# Altium footprint library aiskylab-01Resistors.PcbLib: 208 footprints (part 12 of 13)
Each footprint in its own frame and in the unit in brackets; x right, y up, seen from the top. Pads: shape width x height; smd on the part's side, far side on the other; paste and mask are expansions set on the pad; w line width, h text height; cw(c..) or ccw(c..) is an arc to the next point about the centre after c.
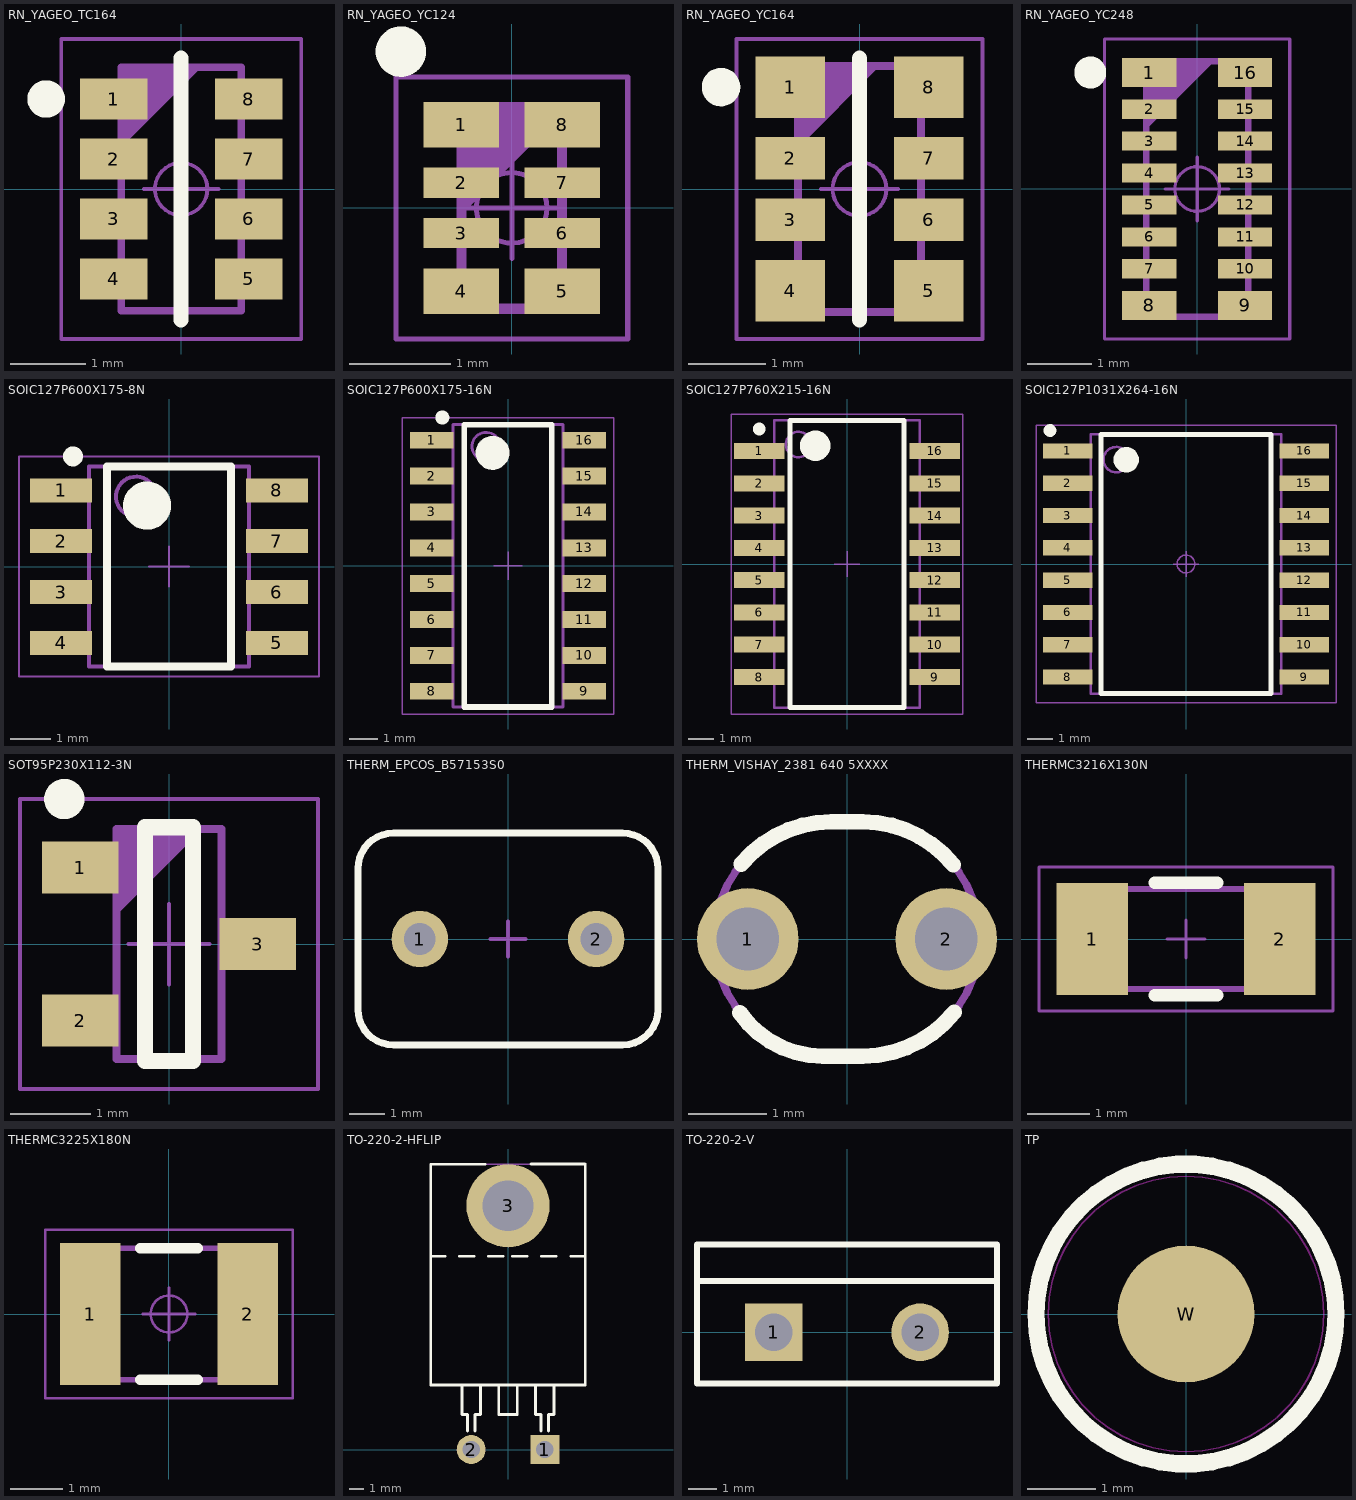
[diagram p11: the footprints below, top view; thin cyan lines are the x and y axes]

## RN_YAGEO_TC164 [mm] "Resistor, Chip Array, Concave, Pitch 0.80mm, 8 pin,1.60mm W X 3.20mm L X 0.70mm H, Type TC164, IPC Medium Density"
height 0.7
pads (8):
  rect 0.9x0.55 smd: 1(-0.9,1.2) 2(-0.9,0.4) 3(-0.9,-0.4) 4(-0.9,-1.2) 5(0.9,-1.2) 6(0.9,-0.4) 7(0.9,0.4) 8(0.9,1.2)
Top Overlay:
  circle w0.25: c-1.8,1.2 r0.125
  lines w0.2: 0,-1.75 0,1.75
Top Designator:
  text ".Designator" at -7.83,-0.508 h1.52
Top Assembly:
  lines w0.1: -0.8,0.625 0.2,1.625 ; -0.8,0.725 0.1,1.625 ; -0.8,0.825 0,1.625 ; -0.8,0.925 -0.1,1.625 ; -0.8,1.025 -0.2,1.625 ; -0.8,1.125 -0.3,1.625 ; -0.8,1.225 -0.4,1.625 ; -0.8,1.325 -0.5,1.625 ; -0.8,1.425 -0.6,1.625 ; -0.8,1.525 -0.7,1.625 ; -0.8,-1.625 -0.8,1.625 0.8,1.625 0.8,-1.625 -0.8,-1.625
Bottom 3D Body:
  circle w0.05: c0,0 r0.35
  lines w0.05: -0.5,0 0.5,0 ; 0,-0.5 0,0.5 ; -1.6,-2 1.6,-2 1.6,2 -1.6,2 -1.6,-2
3D body "p090-055.stp": height 0.02, standoff 0, extent -1.35,-1.475 -0.45,-0.925
3D body "p090-055.stp": height 0.02, standoff 0, extent -1.35,-0.675 -0.45,-0.125
3D body "p090-055.stp": height 0.02, standoff 0, extent -1.35,0.125 -0.45,0.675
3D body "p090-055.stp": height 0.02, standoff 0, extent -1.35,0.925 -0.45,1.475
3D body "p090-055.stp": height 0.02, standoff 0, extent 0.45,-1.475 1.35,-0.925
3D body "p090-055.stp": height 0.02, standoff 0, extent 0.45,-0.675 1.35,-0.125
3D body "p090-055.stp": height 0.02, standoff 0, extent 0.45,0.125 1.35,0.675
3D body "p090-055.stp": height 0.02, standoff 0, extent 0.45,0.925 1.35,1.475
3D body "RN_YAGEO_TC164.stp": height 0.7, standoff 0, extent -0.8,-1.65 0.8,1.65

## RN_YAGEO_YC124 [mm] "Resistor, Chip Array, Convex S Version, Pitch 0.50mm, 8 pin, 1mm W X 2mm L X 0.55mm H, Type YC124, IPC Medium Density"
height 0.7
pads (8):
  rect 0.75x0.45 smd: 1(-0.5,0.825) 4(-0.5,-0.825) 5(0.5,-0.825) 8(0.5,0.825)
  rect 0.75x0.3 smd: 2(-0.5,0.25) 3(-0.5,-0.25) 6(0.5,-0.25) 7(0.5,0.25)
Top Overlay:
  circle w0.25: c-1.1,1.55 r0.125
Top Designator:
  text ".Designator" at -7.705,-0.27 h1.52
Top Assembly:
  lines w0.1: 0.5,1 0.5,-1 -0.5,-1 -0.5,1 0.5,1 ; 0.5,1 -0.5,0 0.5,1 ; -0.5,0.1 0.4,1 -0.5,0.1 ; -0.5,0.2 0.3,1 -0.5,0.2 ; -0.5,0.3 0.2,1 -0.5,0.3 ; -0.5,0.4 0.1,1 -0.5,0.4 ; -0.5,0.5 0,1 -0.5,0.5 ; -0.5,0.6 -0.1,1 -0.5,0.6 ; -0.5,0.7 -0.2,1 -0.5,0.7 ; -0.5,0.8 -0.3,1 -0.5,0.8 ; -0.5,0.9 -0.4,1 -0.5,0.9
Bottom 3D Body:
  circle w0.05: c0,0 r0.35
  lines w0.05: -0.5,0 0.5,0 ; 0,-0.5 0,0.5 ; -1.15,-1.3 -1.15,1.3 1.15,1.3 1.15,-1.3 -1.15,-1.3
3D body "p075-030.stp": height 0.02, standoff 0, extent -0.875,-0.4 -0.125,-0.1
3D body "p075-045.stp": height 0.02, standoff 0, extent -0.875,-1.05 -0.125,-0.6
3D body "p075-030.stp": height 0.02, standoff 0, extent -0.875,0.1 -0.125,0.4
3D body "p075-045.stp": height 0.02, standoff 0, extent -0.875,0.6 -0.125,1.05
3D body "p075-030.stp": height 0.02, standoff 0, extent 0.125,-0.4 0.875,-0.1
3D body "p075-045.stp": height 0.02, standoff 0, extent 0.125,-1.05 0.875,-0.6
3D body "p075-030.stp": height 0.02, standoff 0, extent 0.125,0.1 0.875,0.4
3D body "p075-045.stp": height 0.02, standoff 0, extent 0.125,0.6 0.875,1.05
3D body "RN_YAGEO_YC124.stp": height 0.55, standoff 0, extent -0.55,-1.05 0.55,1.05

## RN_YAGEO_YC164 [mm] "Resistor, Chip Array, Convex S Version, Pitch 0.80mm, 8 pin, 1.60mm W X 3.20mm L X 0.70mm H, Type YC164, IPC Medium Density"
height 0.7
pads (8):
  rect 0.9x0.8 smd: 1(-0.9,1.325) 4(-0.9,-1.325) 5(0.9,-1.325) 8(0.9,1.325)
  rect 0.9x0.55 smd: 2(-0.9,0.4) 3(-0.9,-0.4) 6(0.9,-0.4) 7(0.9,0.4)
Top Overlay:
  circle w0.25: c-1.8,1.325 r0.125
  lines w0.2: 0,-1.7 0,1.7
Top Designator:
  text ".Designator" at -7.83,-0.508 h1.52
Top Assembly:
  lines w0.1: -0.8,-1.6 -0.8,1.6 0.8,1.6 0.8,-1.6 -0.8,-1.6 ; -0.8,0.6 0.2,1.6 -0.8,0.6 ; -0.8,0.7 0.1,1.6 -0.8,0.7 ; -0.8,0.8 0,1.6 -0.8,0.8 ; -0.8,0.9 -0.1,1.6 -0.8,0.9 ; -0.8,1 -0.2,1.6 -0.8,1 ; -0.8,1.1 -0.3,1.6 -0.8,1.1 ; -0.8,1.2 -0.4,1.6 -0.8,1.2 ; -0.8,1.3 -0.5,1.6 -0.8,1.3 ; -0.8,1.4 -0.6,1.6 -0.8,1.4 ; -0.8,1.5 -0.7,1.6 -0.8,1.5
Bottom 3D Body:
  circle w0.05: c0,0 r0.35
  lines w0.05: -0.5,0 0.5,0 ; 0,-0.5 0,0.5 ; -1.6,-1.95 1.6,-1.95 1.6,1.95 -1.6,1.95 -1.6,-1.95
3D body "p090-055.stp": height 0.02, standoff 0, extent -1.35,-0.675 -0.45,-0.125
3D body "p090-080.stp": height 0.02, standoff 0, extent -1.35,-1.75 -0.45,-0.95
3D body "p090-055.stp": height 0.02, standoff 0, extent -1.35,0.125 -0.45,0.675
3D body "p090-080.stp": height 0.02, standoff 0, extent -1.35,0.925 -0.45,1.725
3D body "p090-055.stp": height 0.02, standoff 0, extent 0.45,-0.675 1.35,-0.125
3D body "p090-080.stp": height 0.02, standoff 0, extent 0.45,-1.725 1.35,-0.925
3D body "p090-055.stp": height 0.02, standoff 0, extent 0.45,0.125 1.35,0.675
3D body "p090-080.stp": height 0.02, standoff 0, extent 0.45,0.925 1.35,1.725
3D body "RN_YAGEO_YC164.stp": height 0.7, standoff 0, extent -0.8,-1.65 0.8,1.65

## RN_YAGEO_YC248 [mm] "Resistor, Chip Array, 0.50mm pitch; 16 pin, 1.60mm W X 4mm L X 0.55mm H, YC248 Serie"
height 0.55
pads (16):
  rect 0.85x0.45 smd: 1(-0.75,1.825) 8(-0.75,-1.825) 9(0.75,-1.825) 16(0.75,1.825)
  rect 0.85x0.3 smd: 2(-0.75,1.25) 3(-0.75,0.75) 4(-0.75,0.25) 5(-0.75,-0.25) 6(-0.75,-0.75) 7(-0.75,-1.25) 10(0.75,-1.25) 11(0.75,-0.75) 12(0.75,-0.25) 13(0.75,0.25) 14(0.75,0.75) 15(0.75,1.25)
Top Overlay:
  circle w0.25: c-1.675,1.825 r0.125
Top Designator:
  text ".Designator" at -7.843,-0.508 h1.52
Top Assembly:
  lines w0.1: -0.8,-2 -0.8,2 0.8,2 0.8,-2 -0.8,-2 ; -0.8,1 0.2,2 -0.8,1 ; -0.8,1.1 0.1,2 -0.8,1.1 ; -0.8,1.2 0,2 -0.8,1.2 ; -0.8,1.3 -0.1,2 -0.8,1.3 ; -0.8,1.4 -0.2,2 -0.8,1.4 ; -0.8,1.5 -0.3,2 -0.8,1.5 ; -0.8,1.6 -0.4,2 -0.8,1.6 ; -0.8,1.7 -0.5,2 -0.8,1.7 ; -0.8,1.8 -0.6,2 -0.8,1.8 ; -0.8,1.9 -0.7,2 -0.8,1.9
Bottom 3D Body:
  circle w0.05: c0,0 r0.35
  lines w0.05: -0.5,0 0.5,0 ; 0,-0.5 0,0.5 ; -1.45,-2.35 -1.45,2.35 1.45,2.35 1.45,-2.35 -1.45,-2.35
3D body "p085-030.stp": height 0.02, standoff 0, extent -1.175,-0.4 -0.325,-0.1
3D body "p085-030.stp": height 0.02, standoff 0, extent -1.175,-0.9 -0.325,-0.6
3D body "p085-030.stp": height 0.02, standoff 0, extent -1.175,-1.4 -0.325,-1.1
3D body "p085-030.stp": height 0.02, standoff 0, extent -1.175,1.1 -0.325,1.4
3D body "p085-030.stp": height 0.02, standoff 0, extent -1.175,0.6 -0.325,0.9
3D body "p085-030.stp": height 0.02, standoff 0, extent -1.175,0.1 -0.325,0.4
3D body "p085-030.stp": height 0.02, standoff 0, extent 0.325,-1.4 1.175,-1.1
3D body "p085-030.stp": height 0.02, standoff 0, extent 0.325,-0.9 1.175,-0.6
3D body "p085-030.stp": height 0.02, standoff 0, extent 0.325,-0.4 1.175,-0.1
3D body "p085-030.stp": height 0.02, standoff 0, extent 0.325,0.1 1.175,0.4
3D body "p085-030.stp": height 0.02, standoff 0, extent 0.325,0.6 1.175,0.9
3D body "p085-030.stp": height 0.02, standoff 0, extent 0.325,1.1 1.175,1.4
3D body "p085-045.stp": height 0.02, standoff 0, extent -1.175,-2.05 -0.325,-1.6
3D body "p085-045.stp": height 0.02, standoff 0, extent -1.175,1.6 -0.325,2.05
3D body "p085-045.stp": height 0.02, standoff 0, extent 0.325,-2.05 1.175,-1.6
3D body "p085-045.stp": height 0.02, standoff 0, extent 0.325,1.6 1.175,2.05
3D body "RN_YAGEO_YC248.stp": height 0.45, standoff 0, extent -0.8,-2 0.8,2

## SOIC127P600X175-8N [mm] "SOIC 8, Pitch 1.27mm - Body 4x5mm, IPC Medium Density"
height 1.75
pads (8):
  rect 1.55x0.6 smd: 1(-2.7,1.905) 2(-2.7,0.635) 3(-2.7,-0.635) 4(-2.7,-1.905) 5(2.7,-1.905) 6(2.7,-0.635) 7(2.7,0.635) 8(2.7,1.905)
Top Overlay:
  circle w0.6: c-0.55,1.525 r0.3
  circle w0.25: c-2.4,2.755 r0.125
  lines w0.2: -1.55,-2.5 1.55,-2.5 1.55,2.5 -1.55,2.5 -1.55,-2.5
Top Designator:
  text ".Designator" at -7.618,-0.393 h1.52
Top Assembly:
  circle w0.1: c-0.825,1.75 r0.5
  lines w0.1: -2,-2.5 -2,2.5 2,2.5 2,-2.5 -2,-2.5
Bottom 3D Body:
  lines w0.05: -0.5,0 0.5,0 ; 0,-0.5 0,0.5 ; -3.75,-2.75 3.75,-2.75 3.75,2.75 -3.75,2.75 -3.75,-2.75
3D body "p155-060.stp": height 0.02, standoff 0, extent -3.475,-0.935 -1.925,-0.335
3D body "p155-060.stp": height 0.02, standoff 0, extent -3.475,0.335 -1.925,0.935
3D body "p155-060.stp": height 0.02, standoff 0, extent 1.925,-0.935 3.475,-0.335
3D body "p155-060.stp": height 0.02, standoff 0, extent 1.925,0.335 3.475,0.935
3D body "p155-060.stp": height 0.02, standoff 0, extent -3.475,-2.205 -1.925,-1.605
3D body "p155-060.stp": height 0.02, standoff 0, extent -3.475,1.605 -1.925,2.205
3D body "p155-060.stp": height 0.02, standoff 0, extent 1.925,-2.205 3.475,-1.605
3D body "p155-060.stp": height 0.02, standoff 0, extent 1.925,1.605 3.475,2.205
3D body "SOIC127P600X175-8N.stp": height 1.75, standoff 0, extent -3.1,-2.5 3.1,2.5

## SOIC127P600X175-16N [mm] "SOIC 16, Pitch 1.27mm - Body 4x10mm, IPC Medium Density"
height 1.75
pads (16):
  rect 1.55x0.6 smd: 1(-2.7,4.445) 2(-2.7,3.175) 3(-2.7,1.905) 4(-2.7,0.635) 5(-2.7,-0.635) 6(-2.7,-1.905) 7(-2.7,-3.175) 8(-2.7,-4.445) 9(2.7,-4.445) 10(2.7,-3.175) 11(2.7,-1.905) 12(2.7,-0.635) 13(2.7,0.635) 14(2.7,1.905) 15(2.7,3.175) 16(2.7,4.445)
Top Overlay:
  circle w0.6: c-0.55,4 r0.3
  circle w0.25: c-2.325,5.25 r0.125
  lines w0.2: -1.55,-5 1.55,-5 1.55,5 -1.55,5 -1.55,-5
Top Designator:
  text ".Designator" at -7.618,-0.395 h1.52
Top Assembly:
  circle w0.1: c-0.775,4.225 r0.5
  lines w0.1: -1.95,-5 -1.95,5 1.95,5 1.95,-5 -1.95,-5
Bottom 3D Body:
  lines w0.05: -0.5,0 0.5,0 ; 0,-0.5 0,0.5 ; -3.75,-5.25 3.75,-5.25 3.75,5.25 -3.75,5.25 -3.75,-5.25
3D body "p155-060.stp": height 0.02, standoff 0, extent -3.475,-4.745 -1.925,-4.145
3D body "p155-060.stp": height 0.02, standoff 0, extent -3.475,-3.475 -1.925,-2.875
3D body "p155-060.stp": height 0.02, standoff 0, extent -3.475,-0.935 -1.925,-0.335
3D body "p155-060.stp": height 0.02, standoff 0, extent -3.475,0.335 -1.925,0.935
3D body "p155-060.stp": height 0.02, standoff 0, extent -3.475,2.875 -1.925,3.475
3D body "p155-060.stp": height 0.02, standoff 0, extent -3.475,4.145 -1.925,4.745
3D body "p155-060.stp": height 0.02, standoff 0, extent 1.925,-4.745 3.475,-4.145
3D body "p155-060.stp": height 0.02, standoff 0, extent 1.925,-3.475 3.475,-2.875
3D body "p155-060.stp": height 0.02, standoff 0, extent 1.925,-0.935 3.475,-0.335
3D body "p155-060.stp": height 0.02, standoff 0, extent 1.925,0.335 3.475,0.935
3D body "p155-060.stp": height 0.02, standoff 0, extent 1.925,2.875 3.475,3.475
3D body "p155-060.stp": height 0.02, standoff 0, extent 1.925,4.145 3.475,4.745
3D body "p155-060.stp": height 0.02, standoff 0, extent -3.475,-2.205 -1.925,-1.605
3D body "p155-060.stp": height 0.02, standoff 0, extent -3.475,1.605 -1.925,2.205
3D body "p155-060.stp": height 0.02, standoff 0, extent 1.925,-2.205 3.475,-1.605
3D body "p155-060.stp": height 0.02, standoff 0, extent 1.925,1.605 3.475,2.205
3D body "SOIC127P600X175-16N.stp": height 1.75, standoff 0, extent -3.1,-5 3.1,5

## SOIC127P760X215-16N [mm] "SOIC, 16-Leads, Body 11.3x5.7mm (max), Pitch 1.27mm, IPC Medium Density"
height 2.15
pads (16):
  rect 2x0.63 smd: 1(-3.45,4.445) 2(-3.45,3.175) 3(-3.45,1.905) 4(-3.45,0.635) 5(-3.45,-0.635) 6(-3.45,-1.905) 7(-3.45,-3.175) 8(-3.45,-4.445) 9(3.45,-4.445) 10(3.45,-3.175) 11(3.45,-1.905) 12(3.45,-0.635) 13(3.45,0.635) 14(3.45,1.905) 15(3.45,3.175) 16(3.45,4.445)
Top Overlay:
  circle w0.6: c-1.25,4.65 r0.3
  circle w0.25: c-3.45,5.31 r0.125
  lines w0.2: -2.25,-5.65 2.25,-5.65 2.25,5.65 -2.25,5.65 -2.25,-5.65
Top Designator:
  text ".Designator" at -7.618,-0.508 h1.52
Top Assembly:
  circle w0.1: c-1.905,4.7 r0.5
  lines w0.1: -2.855,-5.65 -2.855,5.65 2.855,5.65 2.855,-5.65 -2.855,-5.65
Bottom 3D Body:
  lines w0.05: -0.5,0 0.5,0 ; 0,-0.5 0,0.5 ; -4.55,-5.9 4.55,-5.9 4.55,5.9 -4.55,5.9 -4.55,-5.9
3D body "p200-063.stp": height 0.02, standoff 0, extent -4.45,-4.76 -2.45,-4.13
3D body "p200-063.stp": height 0.02, standoff 0, extent -4.45,-3.49 -2.45,-2.86
3D body "p200-063.stp": height 0.02, standoff 0, extent -4.45,-0.95 -2.45,-0.32
3D body "p200-063.stp": height 0.02, standoff 0, extent -4.45,0.32 -2.45,0.95
3D body "p200-063.stp": height 0.02, standoff 0, extent -4.45,2.86 -2.45,3.49
3D body "p200-063.stp": height 0.02, standoff 0, extent -4.45,4.13 -2.45,4.76
3D body "p200-063.stp": height 0.02, standoff 0, extent 2.45,-4.76 4.45,-4.13
3D body "p200-063.stp": height 0.02, standoff 0, extent 2.45,-3.49 4.45,-2.86
3D body "p200-063.stp": height 0.02, standoff 0, extent 2.45,-0.95 4.45,-0.32
3D body "p200-063.stp": height 0.02, standoff 0, extent 2.45,0.32 4.45,0.95
3D body "p200-063.stp": height 0.02, standoff 0, extent 2.45,2.86 4.45,3.49
3D body "p200-063.stp": height 0.02, standoff 0, extent 2.45,4.13 4.45,4.76
3D body "p200-063.stp": height 0.02, standoff 0, extent -4.45,-2.22 -2.45,-1.59
3D body "p200-063.stp": height 0.02, standoff 0, extent -4.45,1.59 -2.45,2.22
3D body "p200-063.stp": height 0.02, standoff 0, extent 2.45,-2.22 4.45,-1.59
3D body "p200-063.stp": height 0.02, standoff 0, extent 2.45,1.59 4.45,2.22
3D body "SOIC127P760X215-16N.stp": height 2.15, standoff -0.02, extent -3.81,-5.65 3.81,5.65

## SOIC127P1031X264-16N [mm] "SOIC, 1.27mm Pitch;16 Pin, 7.49mm W X 10.21mm L X 2.64mm H body, IPC Medium Density"
height 2.64
pads (16):
  rect 1.95x0.6 smd: 1(-4.65,4.445) 2(-4.65,3.175) 3(-4.65,1.905) 4(-4.65,0.635) 5(-4.65,-0.635) 6(-4.65,-1.905) 7(-4.65,-3.175) 8(-4.65,-4.445) 9(4.65,-4.445) 10(4.65,-3.175) 11(4.65,-1.905) 12(4.65,-0.635) 13(4.65,0.635) 14(4.65,1.905) 15(4.65,3.175) 16(4.65,4.445)
Top Overlay:
  circle w0.5: c-2.35,4.1 r0.25
  circle w0.25: c-5.35,5.25 r0.125
  lines w0.2: -3.35,-5.1 3.35,-5.1 3.35,5.1 -3.35,5.1 -3.35,-5.1
Top Designator:
  text ".Designator" at -7.618,-0.495 h1.52
Top Assembly:
  circle w0.1: c-2.745,4.105 r0.5
  lines w0.1: -3.745,-5.105 -3.745,5.105 3.745,5.105 3.745,-5.105 -3.745,-5.105
Bottom 3D Body:
  circle w0.05: c0,0 r0.35
  lines w0.05: -0.5,0 0.5,0 ; 0,-0.5 0,0.5 ; -5.9,-5.45 5.9,-5.45 5.9,5.45 -5.9,5.45 -5.9,-5.45
3D body "p195-060.stp": height 0.02, standoff 0, extent -5.625,-4.745 -3.675,-4.145
3D body "p195-060.stp": height 0.02, standoff 0, extent -5.625,-3.475 -3.675,-2.875
3D body "p195-060.stp": height 0.02, standoff 0, extent -5.625,-0.935 -3.675,-0.335
3D body "p195-060.stp": height 0.02, standoff 0, extent -5.625,0.335 -3.675,0.935
3D body "p195-060.stp": height 0.02, standoff 0, extent -5.625,2.875 -3.675,3.475
3D body "p195-060.stp": height 0.02, standoff 0, extent -5.625,4.145 -3.675,4.745
3D body "p195-060.stp": height 0.02, standoff 0, extent 3.675,-4.745 5.625,-4.145
3D body "p195-060.stp": height 0.02, standoff 0, extent 3.675,-3.475 5.625,-2.875
3D body "p195-060.stp": height 0.02, standoff 0, extent 3.675,-0.935 5.625,-0.335
3D body "p195-060.stp": height 0.02, standoff 0, extent 3.675,0.335 5.625,0.935
3D body "p195-060.stp": height 0.02, standoff 0, extent 3.675,2.875 5.625,3.475
3D body "p195-060.stp": height 0.02, standoff 0, extent 3.675,4.145 5.625,4.745
3D body "p195-060.stp": height 0.02, standoff 0, extent -5.625,-2.205 -3.675,-1.605
3D body "p195-060.stp": height 0.02, standoff 0, extent -5.625,1.605 -3.675,2.205
3D body "p195-060.stp": height 0.02, standoff 0, extent 3.675,-2.205 5.625,-1.605
3D body "p195-060.stp": height 0.02, standoff 0, extent 3.675,1.605 5.625,2.205
3D body "SOIC127P1031X264-16N.stp": height 2.65, standoff 0, extent -5.215,-5.151 5.215,5.151

## SOT95P230X112-3N [mm] "SOT23 3-Leads, Pitch 0.95mm - Body 1.3x2.86mm, IPC Medium Density"
height 1.1
pads (3):
  rect 0.95x0.65 smd: 1(-1.1,0.95) 2(-1.1,-0.95) 3(1.1,0)
Top Overlay:
  circle w0.25: c-1.3,1.8 r0.125
  lines w0.2: -0.3,-1.45 -0.3,1.45 0.3,1.45 0.3,-1.45 -0.3,-1.45
Top Designator:
  text ".Designator" at -7.618,-0.395 h1.52
Top Assembly:
  lines w0.1: -0.65,0.43 0.35,1.43 ; -0.65,0.53 0.25,1.43 ; -0.65,0.63 0.15,1.43 ; -0.65,0.73 0.05,1.43 ; -0.65,0.83 -0.05,1.43 ; -0.65,0.93 -0.15,1.43 ; -0.65,1.03 -0.25,1.43 ; -0.65,1.13 -0.35,1.43 ; -0.65,1.23 -0.45,1.43 ; -0.65,1.33 -0.55,1.43 ; -0.65,-1.43 -0.65,1.43 0.65,1.43 0.65,-1.43 -0.65,-1.43
Bottom 3D Body:
  lines w0.05: -0.5,0 0.5,0 ; 0,-0.5 0,0.5 ; -1.85,-1.8 1.85,-1.8 1.85,1.8 -1.85,1.8 -1.85,-1.8
3D body "p095-065.stp": height 0.02, standoff 0, extent -1.575,-1.275 -0.625,-0.625
3D body "p095-065.stp": height 0.02, standoff 0, extent -1.575,0.625 -0.625,1.275
3D body "p095-065.stp": height 0.02, standoff 0, extent 0.625,-0.325 1.575,0.325
3D body "SOT95P240X110-3N.stp": height 1.1, standoff 0, extent -1.25,-1.5 1.25,1.5

## THERM_EPCOS_B57153S0 [mm] "NTC thermistors, Body  D 8.5mm x W 6mm x H 13mmxxx"
height 13
pads (2):
  round 1.6 hole 0.9: 1(-2.5,0) 2(2.5,0)
Top Overlay:
  lines w0.2: -4.25,-2 ccw(c-3.25,-2) -3.25,-3 3.25,-3 ccw(c3.25,-2) 4.25,-2 4.25,2 ccw(c3.25,2) 3.25,3 -3.25,3 ccw(c-3.25,2) -4.25,2 -4.25,-2
Top Designator:
  text ".Designator" at -7.618,-0.508 h1.52
Top Assembly:
  lines w0.1: -4.25,-2 ccw(c-3.25,-2) -3.25,-3 3.25,-3 ccw(c3.25,-2) 4.25,-2 4.25,2 ccw(c3.25,2) 3.25,3 -3.25,3 ccw(c-3.25,2) -4.25,2 -4.25,-2
Top Dimensions:
  lines w0.1: -3,0 -2.5,0 ; -2.5,-0.5 -2.5,0 ; -2.5,0.5 -2.5,0 ; -2,0 -2.5,0 ; -0.5,0 0,0 ; 0,-0.5 0,0 ; 0,0.5 0,0 ; 0.5,0 0,0 ; 2,0 2.5,0 ; 2.5,-0.5 2.5,0 ; 2.5,0.5 2.5,0 ; 3,0 2.5,0
3D body "v160-090.stp": height 0.02, standoff -1.65, extent -3.3,-0.8 -1.7,0.8
3D body "v160-090.stp": height 0.02, standoff -1.65, extent 1.7,-0.8 3.3,0.8
3D body "THERM_EPCOS_B57153S0.stp": height 13, standoff -3.8, extent -4.25,-3 4.25,3

## THERM_VISHAY_2381 640 5XXXX [mm] "RM_VISHAY_2381 640 5xxxx, Body 3.4x3mm"
height 9
pads (2):
  round 1.3 hole 0.8: 1(-1.27,0) 2(1.27,0)
Top Overlay:
  lines w0.2: -1.372,-0.942 ccw(c-0.308,-0.205) -0.308,-1.5 0.2,-1.5 ccw(c0.2,0) 1.371,-0.937 ; -1.352,0.96 cw(c-0.2,0) -0.2,1.5 0.2,1.5 cw(c0.2,0) 1.361,0.95
Top Designator:
  text ".Designator" at -7.617,-0.508 h1.52
Top Assembly:
  lines w0.1: 0.2,1.5 cw(c0.2,0) 0.2,-1.5 -0.2,-1.5 cw(c-0.2,0) -0.2,1.5 0.25,1.5
3D body "v160-090.stp": height 0.02, standoff -1.65, extent 0.47,-0.8 2.07,0.8
3D body "v160-090.stp": height 0.02, standoff -1.65, extent -2.07,-0.8 -0.47,0.8
3D body "THERM_VISHAY_2381 640 5XXXX.stp": height 9, standoff -2.8, extent -1.7,-1.5 1.7,1.5

## THERMC3216X130N [mm] "Chip Thermistor Body 3.2x1.6mm, IPC Medium Density"
height 1.3
pads (2):
  rect 1.15x1.8 smd: 1(-1.5,0) 2(1.5,0)
Top Overlay:
  lines w0.2: -0.5,-0.9 0.5,-0.9 ; -0.5,0.9 0.5,0.9
Top Designator:
  text ".Designator" at -7.618,-0.508 h1.52
Top Assembly:
  lines w0.1: -1.6,-0.8 1.6,-0.8 1.6,0.8 -1.6,0.8 -1.6,-0.8
Bottom 3D Body:
  lines w0.05: -0.3,0 0.3,0 ; 0,-0.3 0,0.3 ; -2.35,-1.15 2.35,-1.15 2.35,1.15 -2.35,1.15 -2.35,-1.15
3D body "p180-115.stp": height 0.02, standoff 0, extent -2.075,-0.9 -0.925,0.9
3D body "THERMC3216X130N.stp": height 1.3, standoff 0, extent -1.7,-0.9 1.7,0.9
3D body "p180-115.stp": height 0.02, standoff 0, extent 0.925,-0.9 2.075,0.9

## THERMC3225X180N [mm] "PTC Thermistors, Chip; 3.20mm L X 2.50mm W X 1.80mm H, IPC Medium Density"
height 1.8
pads (2):
  rect 1.15x2.7 smd: 1(-1.5,0) 2(1.5,0)
Top Overlay:
  lines w0.2: -0.55,-1.25 0.55,-1.25 ; -0.55,1.25 0.55,1.25
Top Designator:
  text ".Designator" at -7.617,-0.508 h1.52
Top Assembly:
  lines w0.1: -1.6,-1.25 -1.6,1.25 1.6,1.25 1.6,-1.25 -1.6,-1.25
Bottom 3D Body:
  circle w0.05: c0,0 r0.35
  lines w0.05: -0.5,0 0.5,0 ; 0,-0.5 0,0.5 ; -2.35,-1.6 -2.35,1.6 2.35,1.6 2.35,-1.6 -2.35,-1.6
3D body "p270-110.stp": height 0.02, standoff 0, extent 0.95,-1.35 2.05,1.35
3D body "THERM_EPCOS_B59607A0120A062.stp": height 1.8, standoff 0, extent -1.7,-1.35 1.7,1.35
3D body "p270-110.stp": height 0.02, standoff 0, extent -2.05,-1.35 -0.95,1.35

## TO-220-2-HFLIP [mm] "TO-220 2-Terminal + Tab - Flipped Horizontal Mount"
height 4.7
pads (3):
  rect 2x2 hole 1.2: 1(2.54,0)
  round 2 hole 1.2: 2(-2.54,0)
  round 5.75 hole 3.5: 3(0,16.828)
Top Overlay:
  lines w0.2: -5.334,13.335 -4.334,13.335 ; -3.334,13.335 -2.334,13.335 ; -3.175,4.445 -3.175,2.413 -2.794,2.413 -2.794,1.27 ; -2.286,1.27 -2.286,2.413 -1.905,2.413 -1.905,4.445 ; -1.6,19.685 -5.334,19.685 -5.334,4.445 5.334,4.445 5.334,19.685 5.319,19.7 1.6,19.7 ; -1.334,13.335 -0.334,13.335 ; -0.635,4.445 -0.635,2.413 0.635,2.413 0.635,4.445 ; 0.3,13.335 1.3,13.335 ; 1.905,4.445 1.905,2.413 2.286,2.413 2.286,1.27 ; 2.3,13.335 3.3,13.335 ; 2.794,1.27 2.794,2.413 3.175,2.413 3.175,4.445 ; 4.334,13.335 5.334,13.335
Top Designator:
  text ".Designator" at -7.618,8.844 h1.52
Top Assembly:
  circle w0.1: c0,16.828 r2
  lines w0.1: -5.334,13.335 -4.334,13.335 ; -3.334,13.335 -2.334,13.335 ; -3.175,4.445 -3.175,2.413 -2.794,2.413 -2.794,1.27 ; -2.286,1.27 -2.286,2.413 -1.905,2.413 -1.905,4.445 ; -1.334,13.335 -0.334,13.335 ; -0.635,4.445 -0.635,2.413 0.635,2.413 0.635,4.445 ; 0.3,13.335 1.3,13.335 ; 1.905,4.445 1.905,2.413 2.286,2.413 2.286,1.27 ; 2.3,13.335 3.3,13.335 ; 2.794,1.27 2.794,2.413 3.175,2.413 3.175,4.445 ; 4.334,13.335 5.334,13.335 ; -5.334,4.445 -5.334,19.685 5.334,19.685 5.334,4.445 -5.334,4.445
3D body "v160-090.stp": height 0.02, standoff -1.65, extent -3.34,-0.8 -1.74,0.8
3D body "v160-090.stp": height 0.02, standoff -1.65, extent 1.74,-0.8 3.34,0.8
3D body "TO-220-2-HFLIP.stp": height 4.7, standoff -4.7, extent -5.27,-0.28 5.27,19.49

## TO-220-2-V [mm] "TO-220 2-Terminal - Vertical Mount"
height 22.86
pads (2):
  rect 2x2 hole 1.3: 1(-2.54,0)
  round 2 hole 1.3: 2(2.54,0)
Top Overlay:
  lines w0.2: -5.207,1.778 5.207,1.778 ; -5.207,-1.778 5.207,-1.778 5.207,3.048 -5.207,3.048 -5.207,-1.778
Top Designator:
  text ".Designator" at -7.618,0.127 h1.52
Top Assembly:
  lines w0.1: -5.207,1.778 5.207,1.778 ; -5.207,-1.778 -5.207,3.048 5.207,3.048 5.207,-1.778 -5.207,-1.778
3D body "v200-130.stp": height 0.02, standoff -1.65, extent -3.54,-1 -1.54,1
3D body "v200-130.stp": height 0.02, standoff -1.65, extent 1.54,-1 3.54,1
3D body "TO-220-2-V.stp": height 20.5, standoff -3.5, extent -5.27,-1.75 5.27,2.95

## TP [mm]
height 11.7
pads (1):
  round 2 smd mask+1: W(0,0)
Top Overlay:
  circle w0.254: c0,0 r2.195
Keep-Out Layer:
  circle w0.025: c0,0 r2.017
Top Designator:
  text ".Designator" at -7.618,-0.508 h1.52
3D body "1_016-1_016-3_tp.stp": height 0.02, standoff 0, extent -1.5,-1.5 1.5,1.5